# Altium footprint library MyPcbLib.PcbLib: 278 footprints (part 9 of 18)
Each footprint in its own frame and in the unit in brackets; x right, y up, seen from the top. Pads: shape width x height; smd on the part's side, far side on the other; paste and mask are expansions set on the pad; w line width, h text height; cw(c..) or ccw(c..) is an arc to the next point about the centre after c.
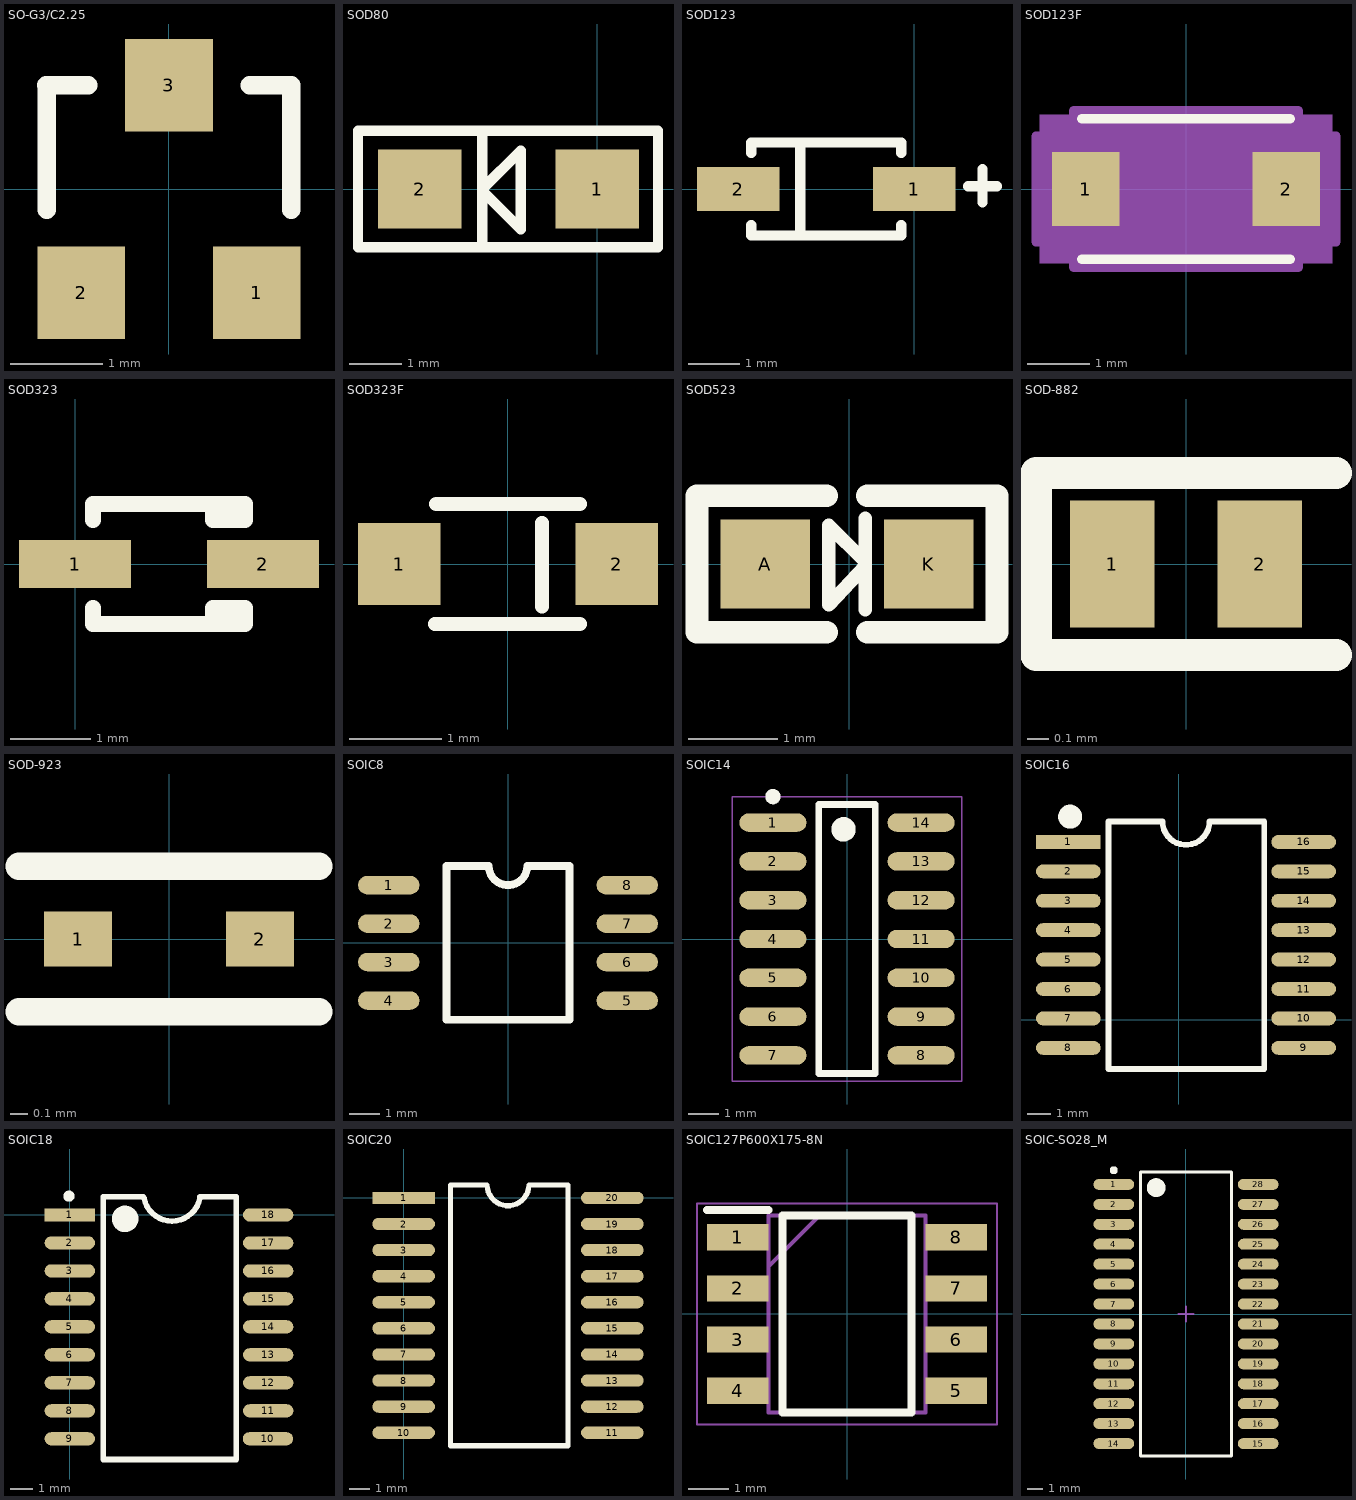
[diagram p8: the footprints below, top view; thin cyan lines are the x and y axes]

## SO-G3/C2.25 [mm] "SOT-23; 3 Leads; Body 3.0 x 2.5 mm, inc. leads (LxW max)"
height 1.2
pads (3):
  rect 0.95x1 smd: 1(0.95,-1.125) 2(-0.95,-1.125) 3(0,1.125)
Top Overlay:
  lines w0.2: -1.328,1.125 -0.875,1.125 ; -1.325,-0.225 -1.325,1.125 ; 0.875,1.125 1.325,1.125 1.325,-0.225
3D body "SOT-23.STEP": height 1.11, standoff 0.01, extent -1.503,-1.26 1.498,1.24

## SOD80 [mm] "LL34"
pads (2):
  rect 1.6x1.524 smd: 1(0,0) 2(-3.4,0)
Top Overlay:
  lines w0.2: -4.588,1.092 -4.588,-1.118 1.168,-1.118 1.168,1.067 ; -4.588,1.118 1.168,1.118 ; -2.2,-1.118 -2.2,1.118 ; -2.2,-0.035 -1.463,-0.772 -1.463,0.737 -2.2,0 -2.2,-0.035
3D body "SOD-80.STEP": height 1.5, standoff 0, extent -3.528,-0.75 -0.028,0.75

## SOD123 [mm] "1206"
pads (2):
  rect 1.6x0.85 smd: 1(0,0) 2(-3.4,0)
Top Overlay:
  lines w0.2: -3.15,-0.7 -3.15,-0.9 -0.25,-0.9 -0.25,-0.7 ; -3.15,0.7 -3.15,0.9 -0.25,0.9 -0.25,0.7 ; -2.2,-0.9 -2.2,0.9 ; 1.043,0.051 1.602,0.051 ; 1.323,-0.254 1.323,0.381
3D body "User Library-SOD-123_DiodesInc.STEP": height 1.42, standoff -0.03, extent -3.596,-0.853 0.254,0.847

## SOD123F [mil]
pads (2):
  rect 43x47 smd paste+0 mask+0: 1(-63.5,0) 2(63.5,0)
Top Overlay:
  lines w6: -66,-44.5 66,-44.5 ; -66,44.5 66,44.5
Mechanical 5:
  region: 92.5,-47 -92.5,-47 -92.5,47 92.5,47
Mechanical 13:
  lines w1: -61,-19.75 -41.25,-39.5 ; -61,19.75 -41.25,39.5 ; -77,-23.5 -61,-23.5 -61,23.5 -77,23.5 -77,-23.5 ; -61,-39.5 -61,39.5 61,39.5 61,-39.5 -61,-39.5 ; 61,-23.5 77,-23.5 77,23.5 61,23.5 61,-23.5
Mechanical 15:
  region: -71,-33.5 -95,-33.5 -95,33.5 -71,33.5 -71,49.5 71,49.5 71,33.5 95,33.5 95,-33.5 71,-33.5 71,-49.5 -71,-49.5
  lines w6: -95,-33.5 -71,-33.5 -71,-49.5 71,-49.5 71,-33.5 95,-33.5 95,33.5 71,33.5 71,49.5 -71,49.5 -71,33.5 -95,33.5 -95,-33.5
3D body "SOD-123F_LTF.step": height 42.99, standoff 0, extent -77,-39.48 77.01,39.49
3D body "SOD-123F_LTF.step": height 42.99, standoff 0, extent -77.01,-39.49 77.01,39.49

## SOD323 [mm] "0805"
pads (2):
  rect 1.4x0.6 smd: 1(0,0) 2(2.35,0)
Top Overlay:
  lines w0.2: 0.225,-0.55 0.225,-0.75 2.125,-0.75 2.125,-0.55 1.725,-0.55 1.725,-0.75 ; 0.225,0.55 0.225,0.75 2.125,0.75 2.125,0.55 1.725,0.55 1.725,0.75
3D body "SOD-323.STEP": height 1, standoff 0, extent -0.169,-0.667 2.431,0.633

## SOD323F [mil] "SODFL, 2-Leads, Body 1.30x2.60mm, IPC Medium Density"
height 39.37
pads (2):
  rect 35x35 smd: 1(-46.26,0) 2(46.26,0)
Top Overlay:
  lines w6: -31,-25.5 30.5,-25.5 ; -30.5,25.5 30.5,25.5 ; 14.44,-18 14.44,17.5
3D body "SOD323.step": height 39.37, standoff 0, extent -51.18,-27.56 51.18,27.56

## SOD523 [mm] "0603"
pads (2):
  rect 1x1 smd: A(-0.94,0) K(0.889,0)
Top Overlay:
  lines w0.152: 0.178,-0.508 0.178,0.508 ; 0.178,-0.025 -0.229,-0.457 -0.229,0.432 0.178,0.025
  lines w0.254: -0.254,-0.762 -1.702,-0.762 -1.702,0.762 -0.254,0.762 ; 0.203,-0.762 1.651,-0.762 1.651,0.762 0.203,0.762
3D body "SOD-523.STEP": height 0.65, standoff 0, extent -0.813,-0.381 0.787,0.419

## SOD-882 [mm]
height 0.5
pads (2):
  rect 0.4x0.6 smd: 1(-0.35,0) 2(0.35,0)
Top Overlay:
  lines w0.152: 0.711,-0.432 -0.711,-0.432 -0.711,0.432 0.711,0.432
3D body "SOD-882.STEP": height 0.5, standoff 0, extent -0.52,-0.32 0.52,0.32

## SOD-923 [mil]
pads (2):
  rect 15x12 smd: 1(-20,0) 2(20,0)
Top Overlay:
  lines w6: -33,-16 33,-16 ; -33,16 33,16
3D body "SOD-923.STEP": height 15.75, standoff 0, extent -20.87,-12.7 20.47,12.8

## SOIC8 [mil]
pads (8):
  oval 80x24 smd: 1(-155,75) 2(-155,25) 3(-155,-25) 4(-155,-75) 5(155,-75) 6(155,-25) 7(155,25) 8(155,75)
Top Overlay:
  lines w10: -80,-100 80,-100 80,100 25,100 cw(c0,100) -25,100 -80,100 -80,-100
3D body "SOIC8.STEP": height 90.55, standoff -0.78, extent -167.2,-105.9 163.21,105.91

## SOIC14 [mm]
height 1.75
pads (14):
  oval 2.2x0.6 smd: 1(-2.425,3.81) 2(-2.425,2.54) 3(-2.425,1.27) 4(-2.425,0) 5(-2.425,-1.27) 6(-2.425,-2.54) 7(-2.425,-3.81) 8(2.425,-3.81) 9(2.425,-2.54) 10(2.425,-1.27) 11(2.425,0) 12(2.425,1.27) 13(2.425,2.54) 14(2.425,3.81)
Top Overlay:
  circle w0.25: c-2.425,4.66 r0.125
  circle w0.4: c-0.115,3.59 r0.2
  lines w0.22: -0.925,-4.4 -0.925,4.4 0.925,4.4 0.925,-4.4 -0.925,-4.4
Mechanical 15:
  lines w0.05: -3.75,-4.65 -3.75,4.65 3.75,4.65 3.75,-4.65 -3.75,-4.65
3D body "SOIC14.STEP": height 1.75, standoff 0, extent -2.896,-4.237 2.904,4.293

## SOIC16 [mil]
pads (16):
  rect 110x23.62 smd: 1(-188,302)
  oval 110x23.62 smd: 2(-188,252) 3(-188,202) 4(-188,152) 5(-188,102) 6(-188,52) 7(-188,2) 8(-188,-48) 9(212,-48) 10(212,2) 11(212,52) 12(212,102) 13(212,152) 14(212,202) 15(212,252) 16(212,302)
Top Overlay:
  lines w10: -120,335 -120,-84 145,-84 145,335 ; -120,337 -28,337 ccw(c12,337) 52,337 145,337
  lines w20: -195.28,345.79 ccw(c-185,345) -194.93,347.77
3D body "User Library-SOIC16_Wide_JEDEC_MS-013AA.step": height 108.23, standoff 3.9, extent -194.25,-79.69 224.25,333.69

## SOIC18 [mm]
height 2.36
pads (18):
  rect 2.286x0.6 smd: 1(0,0)
  oval 2.286x0.6 smd: 2(0,-1.27) 3(0,-2.54) 4(0,-3.81) 5(0,-5.08) 6(0,-6.35) 7(0,-7.62) 8(0,-8.89) 9(0,-10.16) 10(8.989,-10.16) 11(8.999,-8.89) 12(8.999,-7.62) 13(8.999,-6.35) 14(8.999,-5.08) 15(8.999,-3.81) 16(8.999,-2.54) 17(8.999,-1.27) 18(8.999,0)
Top Overlay:
  circle w0.25: c-0.041,0.85 r0.125
  circle w0.6: c2.509,-0.18 r0.3
  lines w0.254: 3.34,0.82 1.509,0.82 1.509,-11.1 7.559,-11.1 7.559,0.82 5.906,0.82 ; 3.364,0.764 ccw(c4.635,1.014) 5.906,0.762
3D body "PIC16F819-I-SOIC18 (1).step": height 2.31, standoff -0.2, extent -0.686,-10.845 9.654,0.685

## SOIC20 [mm]
pads (20):
  rect 3.048x0.6 smd: 1(0,0)
  oval 3.048x0.6 smd: 2(0,-1.27) 3(0,-2.54) 4(0,-3.81) 5(0,-5.08) 6(0,-6.35) 7(0,-7.62) 8(0,-8.89) 9(0,-10.16) 10(0,-11.43) 11(10.16,-11.43) 12(10.16,-10.16) 13(10.16,-8.89) 14(10.16,-7.62) 15(10.16,-6.35) 16(10.16,-5.08) 17(10.16,-3.81) 18(10.16,-2.54) 19(10.16,-1.27) 20(10.16,0)
Top Overlay:
  lines w0.254: 2.286,-12.065 2.286,0.635 4.064,0.635 ccw(c5.08,0.635) 6.096,0.635 8.001,0.635 8.001,-12.065 2.286,-12.065
3D body "User Library-SOIC20-300.STEP": height 2.65, standoff 0, extent -0.045,-12.09 10.255,0.71

## SOIC127P600X175-8N [mm]
height 0.508
pads (8):
  rect 1.525x0.65 smd: 1(-2.712,1.905) 2(-2.712,0.635) 3(-2.712,-0.635) 4(-2.712,-1.905) 5(2.712,-1.905) 6(2.712,-0.635) 7(2.712,0.635) 8(2.712,1.905)
Top Overlay:
  lines w0.2: -3.475,2.58 -1.95,2.58 ; -1.6,-2.45 1.6,-2.45 1.6,2.45 -1.6,2.45 -1.6,-2.45
Mechanical 13:
  lines w0.1: -1.95,1.18 -0.68,2.45 ; -1.95,-2.45 1.95,-2.45 1.95,2.45 -1.95,2.45 -1.95,-2.45
Mechanical 15:
  lines w0.05: -3.725,-2.75 3.725,-2.75 3.725,2.75 -3.725,2.75 -3.725,-2.75
3D body "LM3404HVMA_NOPB.stp": height 1.75, standoff 0, extent -3,-2.45 3,2.45

## SOIC-SO28_M [mm] "SOIC, 28-Leads, Body 17.9x7.5mm, Pitch 1.27mm, IPC Low Density"
height 2.65
pads (28):
  oval 2.6x0.7 smd: 1(-4.6,8.255) 2(-4.6,6.985) 3(-4.6,5.715) 4(-4.6,4.445) 5(-4.6,3.175) 6(-4.6,1.905) 7(-4.6,0.635) 8(-4.6,-0.635) 9(-4.6,-1.905) 10(-4.6,-3.175) 11(-4.6,-4.445) 12(-4.6,-5.715) 13(-4.6,-6.985) 14(-4.6,-8.255) 15(4.6,-8.255) 16(4.6,-6.985) 17(4.6,-5.715) 18(4.6,-4.445) 19(4.6,-3.175) 20(4.6,-1.905) 21(4.6,-0.635) 22(4.6,0.635) 23(4.6,1.905) 24(4.6,3.175) 25(4.6,4.445) 26(4.6,5.715) 27(4.6,6.985) 28(4.6,8.255)
Top Overlay:
  circle w0.6: c-1.9,8.05 r0.3
  circle w0.25: c-4.6,9.155 r0.125
  lines w0.2: -2.9,-9.05 2.9,-9.05 2.9,9.05 -2.9,9.05 -2.9,-9.05
Mechanical 15:
  lines w0.1: -0.5,0 0.5,0 ; 0,-0.5 0,0.5
3D body "User Library-80072036 SO28.STEP": height 2.63, standoff -0.01, extent -5.36,-9.012 5.31,9.068